# Altium footprint library TranDangKhoa-LIB.PcbLib: 1435 footprints (part 61 of 90)
Each footprint in its own frame and in the unit in brackets; x right, y up, seen from the top. Pads: shape width x height; smd on the part's side, far side on the other; paste and mask are expansions set on the pad; w line width, h text height; cw(c..) or ccw(c..) is an arc to the next point about the centre after c.
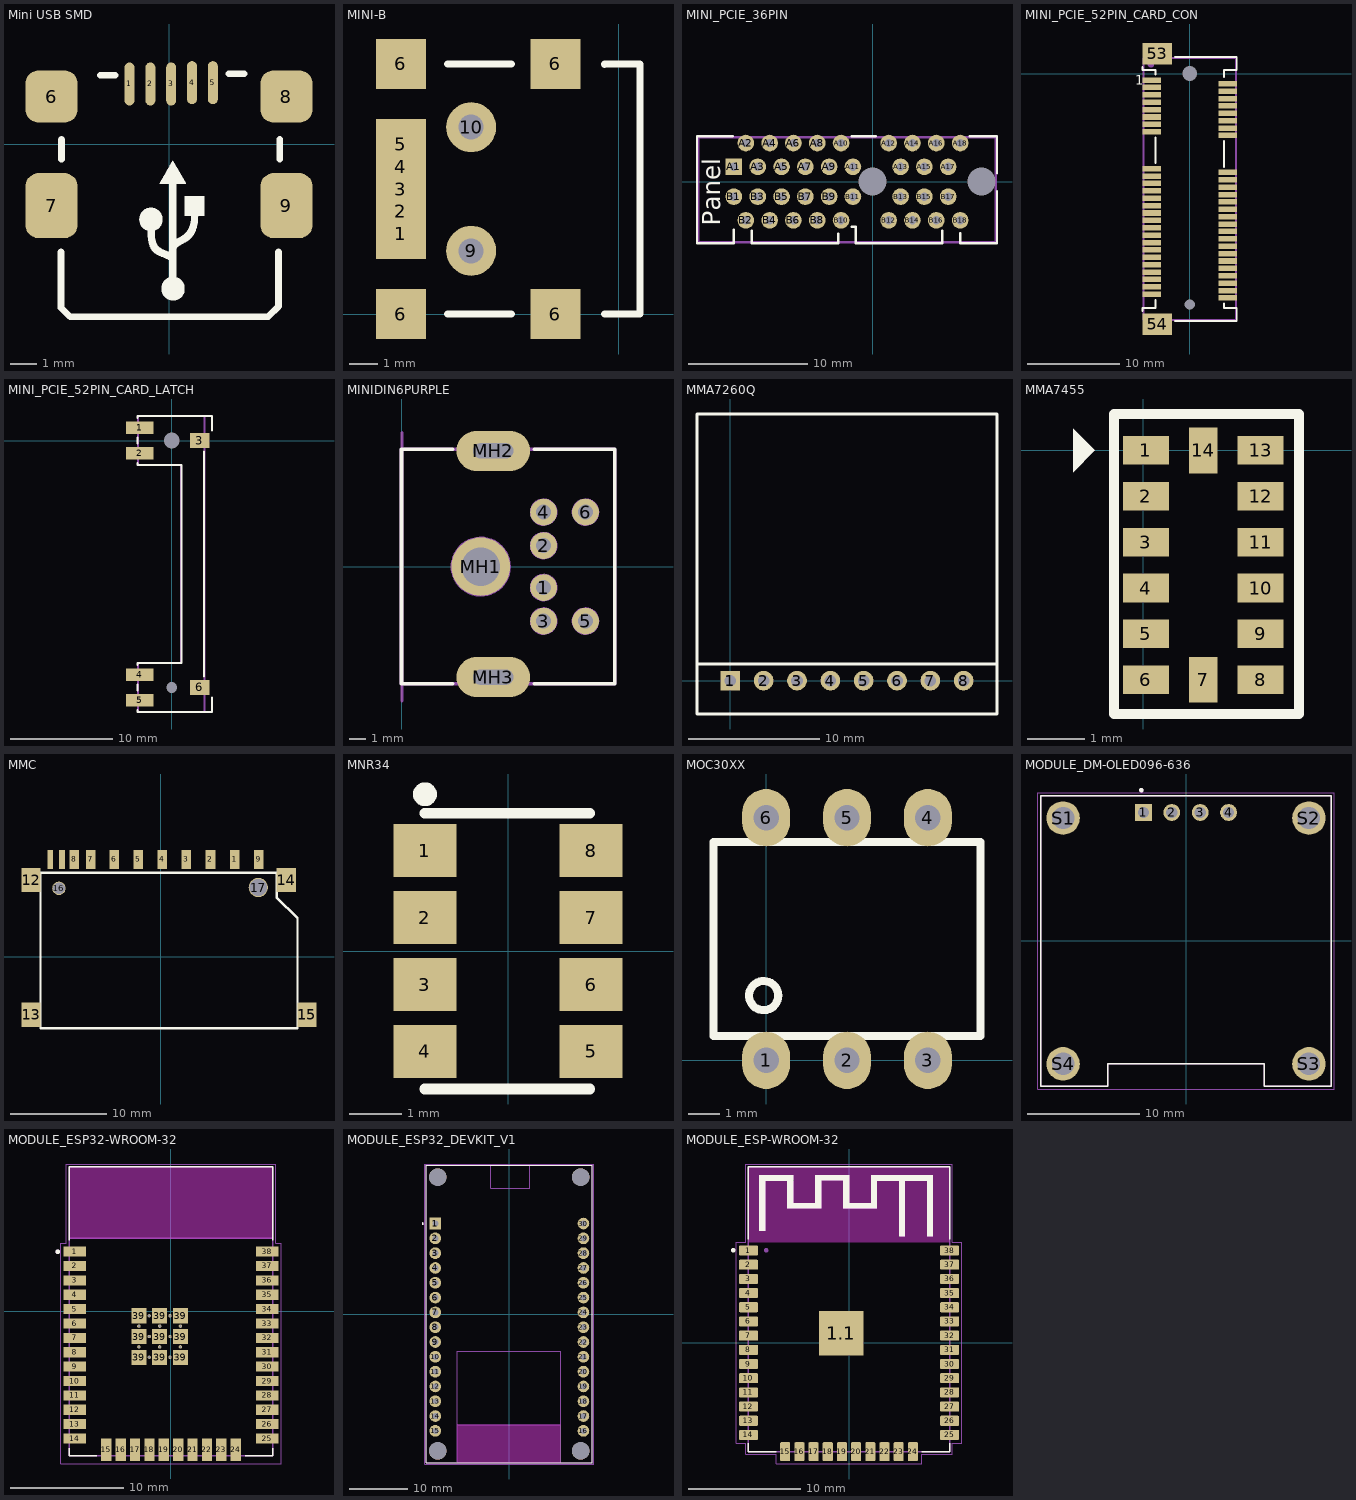
[diagram p60: the footprints below, top view; thin cyan lines are the x and y axes]

## Mini USB SMD [mil]
pads (9):
  oval 15x65 smd: 1(-59.7,90.98) 2(-28.21,90.98) 3(3.29,90.98) 4(34.78,92.95) 5(66.28,92.95)
  rrect50% 78.74x78.74 smd: 6(-177.5,72.05) 8(177.5,72.05)
  rrect50% 78.74x98.43 smd: 7(-177.5,-92.95) 9(177.5,-92.95)
Top Overlay:
  drawing of 1149 lines, arcs and shapes, not listed
3D body "SW3dPS-548190572_USBBMINI.STEP": height 157.48, standoff -1.97, extent -191.6,-252.52 198.17,101.81

## MINI-B [mil]
pads (11):
  rect 70x70 smd: 1(-305.12,112.2) 2(-305.12,143.7) 3(-305.12,175.2) 4(-305.12,206.69) 5(-305.12,238.19) 6(-305.12,0) 6(-305.12,350.39) 6(-88.58,0) 6(-88.58,350.39)
  round 70 hole 35 unplated: 9(-206.69,88.58) 10(-206.69,261.81)
Top Overlay:
  lines w10: -240,0 -150,0 ; -240,350.39 -150,350.39 ; -20,0 30,0 30,350.39 -20,350

## MINI_PCIE_36PIN [mm] "Creator MM. Bad shape of 3d model."
height 11.25
pads (38):
  rrect70% 0x0 hole 2.35: 1(0,0) 2(9.15,0)
  rect 1.4x1.4 hole 0.7: A1(-11.65,1.25)
  round 1.4 hole 0.7: A2(-10.65,3.25) A3(-9.65,1.25) A4(-8.65,3.25) A5(-7.65,1.25) A6(-6.65,3.25) A7(-5.65,1.25) A8(-4.65,3.25) A9(-3.65,1.25) A10(-2.65,3.25) A11(-1.65,1.25) A12(1.35,3.25) A13(2.35,1.25) A14(3.35,3.25) A15(4.35,1.25) A16(5.35,3.25) A17(6.35,1.25) A18(7.35,3.25) B1(-11.65,-1.25) B2(-10.65,-3.25) B3(-9.65,-1.25) B4(-8.65,-3.25) B5(-7.65,-1.25) B6(-6.65,-3.25) B7(-5.65,-1.25) B8(-4.65,-3.25) B9(-3.65,-1.25) B10(-2.65,-3.25) B11(-1.65,-1.25) B12(1.35,-3.25) B13(2.35,-1.25) B14(3.35,-3.25) B15(4.35,-1.25) B16(5.35,-3.25) B17(6.35,-1.25) B18(7.35,-3.25)
Top Overlay:
  lines w0.2: -11.75,3.825 -14.75,3.825 -14.75,-5.175 -11.65,-5.175 -11.65,-4.025 ; -10.15,-4.125 -10.15,-5.175 -2.9,-5.175 -2.9,-4.375 ; -1.75,-3.775 -1.4,-3.775 -1.4,-5.175 5.85,-5.175 5.85,-4.125 ; -1.75,3.825 0.25,3.825 ; 7.35,-4.325 7.35,-5.175 10.45,-5.175 10.45,-0.8 ; 8.15,3.825 10.45,3.825 10.45,0.7
  text "Panel" at -12.8,-3.7 h1.5
Mechanical 16:
  lines w0.2: -14.65,-5.075 10.35,-5.075 10.35,3.725 -14.65,3.725 -14.65,-5.075
Mechanical 29:
  text ".Designator" at -0.5,0.3 h1.52
3D body "c-4-1612163-1-h-3d.stp": height 10, standoff -5.4, extent -14.65,-5.1 10.35,3.6

## MINI_PCIE_52PIN_CARD_CON [mm] "Creator MM"
height 5.9
pads (56):
  rect 2x0.6 smd mask+0.05: 1(-4.1,-0.7) 2(4.1,-1.1) 3(-4.1,-1.5) 4(4.1,-1.9) 5(-4.1,-2.3) 6(4.1,-2.7) 7(-4.1,-3.1) 8(4.1,-3.5) 9(-4.1,-3.9) 10(4.1,-4.3) 11(-4.1,-4.7) 12(4.1,-5.1) 13(-4.1,-5.5) 14(4.1,-5.9) 15(-4.1,-6.3) 16(4.1,-6.7) 17(-4.1,-10.3) 18(4.1,-10.7) 19(-4.1,-11.1) 20(4.1,-11.5) 21(-4.1,-11.9) 22(4.1,-12.3) 23(-4.1,-12.7) 24(4.1,-13.1) 25(-4.1,-13.5) 26(4.1,-13.9) 27(-4.1,-14.3) 28(4.1,-14.7) 29(-4.1,-15.1) 30(4.1,-15.5) 31(-4.1,-15.9) 32(4.1,-16.3) 33(-4.1,-16.7) 34(4.1,-17.1) 35(-4.1,-17.5) 36(4.1,-17.9) 37(-4.1,-18.3) 38(4.1,-18.7) 39(-4.1,-19.1) 40(4.1,-19.5) 41(-4.1,-19.9) 42(4.1,-20.3) 43(-4.1,-20.7) 44(4.1,-21.1) 45(-4.1,-21.5) 46(4.1,-21.9) 47(-4.1,-22.3) 48(4.1,-22.7) 49(-4.1,-23.1) 50(4.1,-23.5) 51(-4.1,-23.9) 52(4.1,-24.3)
  rect 3.2x2.3 smd: 53(-3.5,2.15) 54(-3.5,-27.15)
  rrect70% 0x0 hole 1.6: 55(0,0)
  rrect70% 0x0 hole 1.1: 56(0,-25)
Top Overlay:
  lines w0.2: -5.1,-25.7 -5.1,-25.4 -3.7,-25.4 -3.7,-24.5 ; -5.1,0.7 -5.1,0.4 -3.7,0.4 -3.7,-0.1 ; -3.7,-9.7 -3.7,-6.9 ; -1.6,-26.8 5.1,-26.8 5.1,-25.4 3.7,-25.4 3.7,-24.9 ; -1.6,1.8 5.1,1.8 5.1,0.4 3.7,0.4 3.7,-0.4 ; 3.7,-10.1 3.7,-7.3
  text "1" at -5.9,-1.2 h1.02
Mechanical 16:
  circle w0.5: c-4.2,1 r0.1
  lines w0.2: -5,-26.7 -5,1.7 5,1.7 5,-26.7 -5,-26.7
Mechanical 29:
  text ".Designator" at -0.8,-12.1 h1.52
3D body "K3D-MM60-52B1-E1-R2 JAE Connector Division Proprietary.STEP": height 5.95, standoff -0.75, extent -5,-27.35 5,2.35

## MINI_PCIE_52PIN_CARD_LATCH [mm] "Creator MM"
height 6.8
pads (8):
  rect 2.7x1.2 smd: 1(-3.15,1.25) 2(-3.15,-1.25) 4(-3.15,-22.95) 5(-3.15,-25.45)
  rect 1.9x1.5 smd: 3(2.75,0) 6(2.75,-24.2)
  rrect70% 0x0 hole 1.55: 7(0,0)
  rrect70% 0x0 hole 1.05: 8(0,-24.2)
Top Overlay:
  lines w0.2: -3.35,-26.4 -3.35,-26.6 3.95,-26.6 3.95,-25.2 ; -3.35,-24.5 -3.35,-23.9 ; -3.35,-22 -3.35,-21.8 0.95,-21.8 0.95,-2.4 -3.35,-2.4 -3.35,-2.2 ; -3.35,-0.3 -3.35,0.3 ; -3.35,2.2 -3.35,2.4 3.95,2.4 3.95,1 ; 3.15,-23.1 3.15,-1.1
Mechanical 16:
  lines w0.2: -3.3,-26.6 -3.3,-21.8 0.9,-21.8 0.9,-2.4 -3.3,-2.4 -3.3,2.4 3.2,2.4 3.2,-26.6 -3.3,-26.6
Mechanical 29:
  text ".Designator" at 1.7,-11.1 h1
3D body "K3D-MM60-EZH059-B5-R2 JAE Connector Division Proprietary.STEP": height 6.7, standoff -0.9, extent -3.95,-26.6 3.95,2.4

## MINI_PCIE_FULL CARD [mm] ".Creator MM"
3D body "PCI Express Mini Card (Full-Mini Card).step": height 6.9, standoff 2.15, extent 0,0 50.95,30

## MINIDIN6PURPLE [mm]
pads (9):
  round 1.6 hole 0.9: 1(8.45,-1.25) 2(8.45,1.25) 3(8.45,-3.25) 4(8.45,3.25) 5(10.95,-3.25) 6(10.95,3.25)
  round 3.5 hole 2.3: MH1(4.7,0)
  oval 4.4x2.4 hole 0.9 slot 2.4 at 0 deg: MH2(5.45,6.905) MH3(5.45,-6.595)
Top Overlay:
  lines w0.2: -0.05,-7 -0.05,7 ; 3.033,-7 0,-7 0,7 3.033,7 ; 7.889,-7 12.7,-7 12.7,7 7.889,7
Mechanical 7:
  circle w0.2: c10.95,3.25 r0.725
  circle w0.2: c10.95,-3.25 r0.725
  circle w0.2: c8.45,-3.25 r0.725
  circle w0.2: c8.45,-1.25 r0.725
  circle w0.2: c8.45,1.25 r0.725
  circle w0.2: c8.45,3.25 r0.725
  circle w0.2: c4.7,0 r1.697
  lines w0.2: 0,-8.001 0,-7 ; 0,8.001 0,7 ; 0,-7 0,7 ; 0,-7 0,7 ; -0.05,-7 12.7,-7 12.7,7 -0.05,7 -0.05,-7
  text "PCB Edge" at 1.143,-6.731 h0.8
3D body "Mini DIN - 6 Way - Purple.stp": height 13, standoff -3.2, extent -0.102,-7.025 12.698,6.975

## MMA7260Q [mm] "Connector; Header; 8 Position"
pads (8):
  rect 1.5x1.5 hole 0.9: 1(0,0)
  round 1.5 hole 0.9: 2(2.54,0) 3(5.08,0) 4(7.62,0) 5(10.16,0) 6(12.7,0) 7(15.24,0) 8(17.78,0)
Top Overlay:
  lines w0.2: -2.54,1.27 20.32,1.27 ; -2.54,-2.54 20.32,-2.54 20.32,20.32 -2.54,20.32 -2.54,-2.54
3D body: height 1, standoff 0, extent -2.54,-2.54 20.32,20.32
3D body: height 2, standoff 1, extent 7.62,7.62 13.97,13.97

## MMA7455 [mm]
pads (14):
  rect 0.8x0.5 smd: 1(0.051,0) 2(0.051,-0.8) 3(0.051,-1.6) 4(0.051,-2.4) 5(0.051,-3.2) 6(0.051,-4) 8(2.051,-4) 9(2.051,-3.2) 10(2.051,-2.4) 11(2.051,-1.6) 12(2.051,-0.8) 13(2.051,0)
  rect 0.5x0.8 smd: 7(1.051,-4) 14(1.051,0)
Top Overlay:
  region: -1.219,0.381 -0.838,0 -1.219,-0.381
  lines w0.178: -0.508,-4.572 -0.508,0.635 2.718,0.635 2.718,-4.597 ; 2.718,-4.597 -0.508,-4.597 2.718,-4.597

## MMC [mm]
pads (17):
  rect 1x2 smd: 1(7.67,10.109) 2(5.17,10.109) 3(2.67,10.109) 4(0.17,10.109) 5(-2.33,10.109) 6(-4.83,10.109) 7(-7.255,10.109) 8(-8.955,10.109) 9(10.17,10.109)
  rect 0.6x2 smd: 10(-10.255,10.109) 11(-11.455,10.109)
  rect 2x2.5 smd: 12(-13.455,7.95) 13(-13.455,-6.02) 14(13.024,7.95) 15(15.183,-6.02)
  round 1.4 hole 1.2: 16(-10.555,7.109)
  round 2 hole 1.8: 17(10.135,7.188)
Top Overlay:
  lines w0.254: -12.471,-7.417 -12.471,8.712 12.04,8.712 12.04,6.172 14.199,4.013 14.199,-7.417 -12.471,-7.417
3D body "User Library-SD Kart.step": height 3, standoff -1, extent -13.436,-20.196 15.164,9.804

## MNR34 [mm] "3216x4 Resistor Array"
pads (8):
  rect 1.2x1 smd: 1(-1.575,1.905) 2(-1.575,0.635) 3(-1.575,-0.635) 4(-1.575,-1.905) 5(1.575,-1.905) 6(1.575,-0.635) 7(1.575,0.635) 8(1.575,1.905)
Top Overlay:
  circle w0.254: c-1.575,2.972 r0.1
  lines w0.2: -1.575,-2.616 1.549,-2.616 ; -1.575,2.616 1.549,2.616

## MOC30XX [mm]
pads (6):
  oval 1.5x1.8 hole 0.8: 1(0,0) 2(2.54,0) 3(5.08,0) 4(5.08,7.62) 5(2.54,7.62) 6(0,7.62)
Top Overlay:
  circle w0.254: c-0.077,2.032 r0.458
  lines w0.254: -1.651,0.762 6.731,0.762 6.731,6.858 -1.651,6.858 -1.651,0.762
3D body "SW3DPS-DIP6-DEFAULT.STEP": height 4.41, standoff -3.18, extent -1.5,-0.19 6.58,7.81

## MODULE_DM-OLED096-636 [mm]
height 11.3
pads (8):
  rect 1.508x1.508 / inner round 1.508 / far side rect 1.508x1.508 hole 1: 1(-3.81,11.5)
  round 1.508 hole 1: 2(-1.27,11.5) 3(1.27,11.5) 4(3.81,11.5)
  round 3 hole 2: S1(-11,11) S2(11,11) S3(11,-11) S4(-11,-11)
Top Overlay:
  circle w0.2: c-4,13.5 r0.1
  lines w0.127: -13,-13 -7,-13 -7,-11 7,-11 7,-13 13,-13 13,13 -13,13 -13,-13
Mechanical 13:
  circle w0.2: c-4,13.5 r0.1
  lines w0.127: -13,-13 -7,-13 -7,-11 7,-11 7,-13 13,-13 13,13 -13,13 -13,-13
Mechanical 15:
  lines w0.05: -13.25,-13.25 13.25,-13.25 13.25,13.25 -13.25,13.25 -13.25,-13.25
3D body "step_temp.STEP": height 5.66, standoff -5.64, extent -13,-13 13,13

## MODULE_ESP32-WROOM-32 [mm]
height 3.2
pads (59):
  rect 2x0.9 smd: 1(-8.5,5.26) 2(-8.5,3.99) 3(-8.5,2.72) 4(-8.5,1.45) 5(-8.5,0.18) 6(-8.5,-1.09) 7(-8.5,-2.36) 8(-8.5,-3.63) 9(-8.5,-4.9) 10(-8.5,-6.17) 11(-8.5,-7.44) 12(-8.5,-8.71) 13(-8.5,-9.98) 14(-8.5,-11.25) 25(8.5,-11.25) 26(8.5,-9.98) 27(8.5,-8.71) 28(8.5,-7.44) 29(8.5,-6.17) 30(8.5,-4.9) 31(8.5,-3.63) 32(8.5,-2.36) 33(8.5,-1.09) 34(8.5,0.18) 35(8.5,1.45) 36(8.5,2.72) 37(8.5,3.99) 38(8.5,5.26)
  rect 0.9x2 smd: 15(-5.715,-12.25) 16(-4.445,-12.25) 17(-3.175,-12.25) 18(-1.905,-12.25) 19(-0.635,-12.25) 20(0.635,-12.25) 21(1.905,-12.25) 22(3.175,-12.25) 23(4.445,-12.25) 24(5.715,-12.25)
  rect 1.33x1.33 smd: 39(-2.835,-4.075) 39(-2.835,-2.24) 39(-2.835,-0.405) 39(-1,-4.075) 39(-1,-2.24) 39(-1,-0.405) 39(0.835,-4.075) 39(0.835,-2.24) 39(0.835,-0.405)
  round 0.3 hole 0.2: 39_10(-1.917,-0.405) 39_11(-0.082,-0.405) 39_12(-2.835,-1.322) 39_13(-1,-1.322) 39_14(0.835,-1.322) 39_15(-1.917,-2.24) 39_16(-0.082,-2.24) 39_17(-2.835,-3.157) 39_18(-1,-3.157) 39_19(0.835,-3.157) 39_20(-1.917,-4.075) 39_21(-0.082,-4.075)
Top Overlay:
  circle w0.2: c-10,5.25 r0.1
  lines w0.127: -9,-12.1 -9,-12.75 -6.55,-12.75 ; -9,6.25 -9,12.75 9,12.75 9,6.25 ; 6.55,-12.75 9,-12.75 9,-12.1
Keep-Out Layer:
  region: 9,6.45 -9,6.45 -9,12.75 9,12.75
  region: 9,6.45 -9,6.45 -9,12.75 9,12.75
Mechanical 13:
  circle w0.2: c-10,5.25 r0.1
  lines w0.127: -9,6.45 -9,-12.75 9,-12.75 9,6.45 ; -9,6.45 -9,12.75 9,12.75 9,6.45 ; -9,6.45 9,6.45
  text "ANTENNA" at -6,9 h1.78
Mechanical 15:
  lines w0.05: -9.75,-13.5 9.75,-13.5 9.75,6 9.25,6 9.25,13 -9.25,13 -9.25,6 -9.75,6 -9.75,-13.5
3D body "step_temp.STEP": height 3.2, standoff 0, extent -9,-12.75 9,12.75

## MODULE_ESP32_DEVKIT_V1 [mm]
height 6.8
pads (34):
  rect 2x2 / inner round 2 / far side rect 2x2 hole 1.02: 1(-12.7,15.515)
  round 2 hole 1.02: 2(-12.7,12.975) 3(-12.7,10.435) 4(-12.7,7.895) 5(-12.7,5.355) 6(-12.7,2.815) 7(-12.7,0.275) 8(-12.7,-2.265) 9(-12.7,-4.805) 10(-12.7,-7.345) 11(-12.7,-9.885) 12(-12.7,-12.425) 13(-12.7,-14.965) 14(-12.7,-17.505) 15(-12.7,-20.045) 16(12.7,-20.045) 17(12.7,-17.505) 18(12.7,-14.965) 19(12.7,-12.425) 20(12.7,-9.885) 21(12.7,-7.345) 22(12.7,-4.805) 23(12.7,-2.265) 24(12.7,0.275) 25(12.7,2.815) 26(12.7,5.355) 27(12.7,7.895) 28(12.7,10.435) 29(12.7,12.975) 30(12.7,15.515)
  round 3 hole 3 unplated: ""(-12.28,-23.475) ""(-12.28,23.475) ""(12.23,-23.475) ""(12.23,23.475)
Top Overlay:
  circle w0.2: c-14.85,15.515 r0.1
  lines w0.127: -14.28,-25.475 14.23,-25.475 ; -14.28,-25.475 -14.28,25.475 ; -14.28,-25.475 -14.28,25.475 ; -14.28,-25.475 -8.91,-25.475 8.78,-25.475 14.23,-25.475 ; -14.28,25.475 14.23,25.475 ; -14.28,25.475 -3.211,25.475 3.5,25.475 14.23,25.475 ; 14.23,-25.475 14.23,25.475 ; 14.23,-25.475 14.23,25.475
Keep-Out Layer:
  region: 8.78,-25.475 -8.91,-25.475 -8.91,-18.985 8.78,-18.985
  region: 8.78,-25.475 -8.91,-25.475 -8.91,-18.985 8.78,-18.985
Mechanical 13:
  circle w0.2: c-14.85,15.515 r0.1
  lines w0.127: -8.91,-25.475 -14.28,-25.475 -14.28,25.475 -3.211,25.475 ; -8.91,-25.475 8.78,-25.475 ; -8.91,-25.475 -8.91,-18.985 ; -8.91,-18.985 -8.91,-6.355 8.78,-6.355 8.78,-18.985 ; -8.91,-18.985 8.78,-18.985 ; -3.211,25.475 3.5,25.475 ; -3.211,25.475 -3.211,21.585 3.5,21.585 3.5,25.475 ; 3.5,25.475 14.23,25.475 14.23,-25.475 8.78,-25.475 ; 8.78,-25.475 8.78,-18.985
Mechanical 15:
  lines w0.05: -14.53,-25.725 -14.53,25.725 14.48,25.725 14.48,-25.725 -14.53,-25.725
3D body "step_temp.STEP": height 7.05, standoff -6, extent -14.1,-25.9 14.1,26.55

## MODULE_ESP-WROOM-32 [mm]
pads (39):
  rrect22% 1.7x0.9 smd: 1(-9,8.255) 2(-9,6.985) 3(-9,5.715) 4(-9,4.445) 5(-9,3.175) 6(-9,1.905) 7(-9,0.635) 8(-9,-0.635) 9(-9,-1.905) 10(-9,-3.175) 11(-9,-4.445) 12(-9,-5.715) 13(-9,-6.985) 14(-9,-8.255) 25(9,-8.255) 26(9,-6.985) 27(9,-5.715) 28(9,-4.445) 29(9,-3.175) 30(9,-1.905) 31(9,-0.635) 32(9,0.635) 33(9,1.905) 34(9,3.175) 35(9,4.445) 36(9,5.715) 37(9,6.985) 38(9,8.255)
  rect 4x4 smd: 1.1(-0.7,0.845)
  rrect22% 0.9x1.7 smd: 15(-5.715,-9.755) 16(-4.445,-9.755) 17(-3.175,-9.755) 18(-1.905,-9.755) 19(-0.635,-9.755) 20(0.635,-9.755) 21(1.905,-9.755) 22(3.175,-9.755) 23(4.445,-9.755) 24(5.715,-9.755)
Top Overlay:
  circle w0.2: c-10.365,8.275 r0.1
  region: 2.5,13.554 2.008,13.554 2.008,15 2.5,15
  region: -7.5,10.025 -8.02,10.025 -8.02,10.5 -7.5,10.5
  region: 5,9.517 4.508,9.517 4.508,10 5,10
  region: 7.5,9.526 7.019,9.526 7.019,10 7.5,10
  region: 5,10.031 4.514,10.031 4.514,15 5,15
  region: 7.5,10.03 7.021,10.03 7.021,15 7.5,15
  region: 7.5,14.514 2.012,14.514 2.012,15 7.5,15
  region: 2.5,12.053 2.009,12.053 2.009,14.5 2.5,14.5
  region: 2.5,12.05 -0.502,12.05 -0.502,12.5 2.5,12.5
  region: 0,12.049 -0.502,12.049 -0.502,14.5 0,14.5
  region: 0,14.549 -3.01,14.549 -3.01,15 0,15
  region: -2.5,12.041 -3.01,12.041 -3.01,14.5 -2.5,14.5
  region: -2.5,12.018 -5.508,12.018 -5.508,12.5 -2.5,12.5
  region: -5,12.047 -5.522,12.047 -5.522,14.5 -5,14.5
  region: -5,14.516 -8.009,14.516 -8.009,15 -5,15
  region: -7.5,10.529 -8.022,10.529 -8.022,15 -7.5,15
  lines w0.127: -9,-9 -9,-9.75 -6.5,-9.75 ; -9,9.25 -9,15.75 9,15.75 9,9.25 ; 6.5,-9.75 9,-9.75 9,-9
Keep-Out Layer:
  region: 9,9.026 -9.026,9.026 -9.026,15.75 9,15.75
  region: 9,9.012 -9.012,9.012 -9.012,15.75 9,15.75
Mechanical 13:
  circle w0.2: c-7.425,8.275 r0.1
  region: 2.5,13.551 2.008,13.551 2.008,15 2.5,15
  region: -7.5,10.033 -8.027,10.033 -8.027,10.5 -7.5,10.5
  region: 5,9.548 4.523,9.548 4.523,10 5,10
  region: 7.5,9.529 7.022,9.529 7.022,10 7.5,10
  region: 5,10.033 4.515,10.033 4.515,15 5,15
  region: 7.5,10.037 7.026,10.037 7.026,15 7.5,15
  region: 7.5,14.541 2.015,14.541 2.015,15 7.5,15
  region: 2.5,12.046 2.008,12.046 2.008,14.5 2.5,14.5
  region: 2.5,12.012 -0.501,12.012 -0.501,12.5 2.5,12.5
  region: 0,12.04 -0.502,12.04 -0.502,14.5 0,14.5
  region: 0,14.531 -3.006,14.531 -3.006,15 0,15
  region: -2.5,12.041 -3.01,12.041 -3.01,14.5 -2.5,14.5
  region: -2.5,12.034 -5.516,12.034 -5.516,12.5 -2.5,12.5
  region: -5,12.04 -5.518,12.04 -5.518,14.5 -5,14.5
  region: -5,14.574 -8.041,14.574 -8.041,15 -5,15
  region: -7.5,10.55 -8.038,10.55 -8.038,15 -7.5,15
  lines w0.127: -9,-9.755 -9,15.745 9,15.745 9,-9.755 -9,-9.755
Mechanical 15:
  lines w0.05: -10.1,-9 -10.1,9 -9.25,9 -9.25,16 9.25,16 9.25,9 10.1,9 10.1,-9 9.25,-9 9.25,-10 6.5,-10 6.5,-10.855 -6.5,-10.855 -6.5,-10 -9.25,-10 -9.25,-9 -10.1,-9
3D body "step_temp.STEP": height 3.25, standoff 0, extent -9,-12.75 9,12.75